# Altium footprint library PCB_Module.PcbLib: 19 footprints (part 2 of 2)
Each footprint in its own frame and in the unit in brackets; x right, y up, seen from the top. Pads: shape width x height; smd on the part's side, far side on the other; paste and mask are expansions set on the pad; w line width, h text height; cw(c..) or ccw(c..) is an arc to the next point about the centre after c.
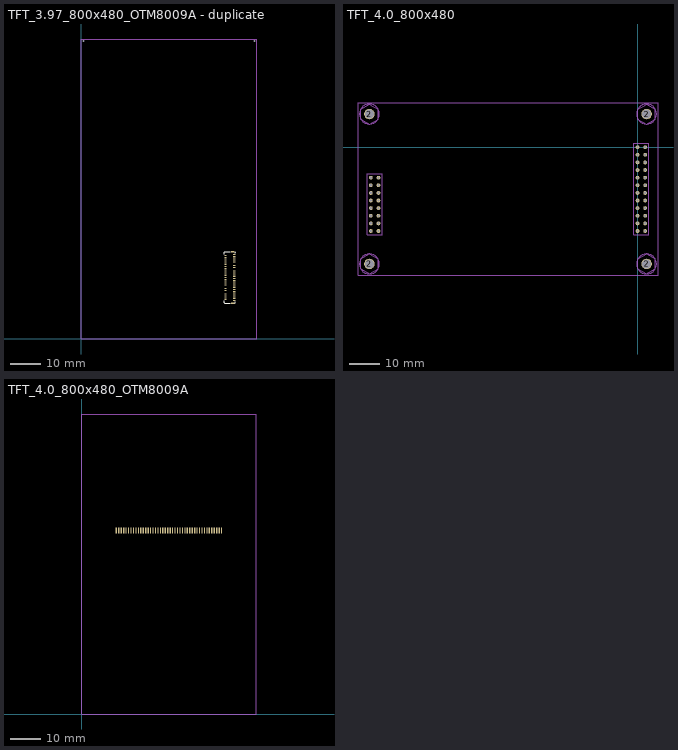
[diagram p1: the footprints below, top view; thin cyan lines are the x and y axes]

## TFT_3.97_800x480_OTM8009A - duplicate [mil]
pads (55):
  round 0 hole 25 mask+0: 0(31.5,3827.38) 0(2226.5,3827.38)
  rect 40x16 smd: 0(1947,459.27) 0(1947,1118.72)
  rect 30x12 smd: 1(1967,1084.28) 2(1855,1072.46) 3(1967,1060.65) 4(1855,1048.84) 5(1967,1037.03) 6(1855,1025.22) 7(1967,1013.41) 8(1855,1001.6) 9(1967,989.79) 10(1855,977.98) 11(1967,966.16) 12(1855,954.35) 13(1967,942.54) 14(1855,930.73) 15(1967.19,918.92) 16(1855,907.11) 17(1967,895.3) 18(1855,883.49) 19(1967,871.68) 20(1855,859.87) 21(1967,848.05) 22(1855,836.24) 23(1967,824.43) 24(1855,812.62) 25(1967,800.81) 26(1855,789) 27(1967,777.19) 28(1855,765.38) 29(1967,753.57) 30(1855,741.76) 31(1967,729.95) 32(1855,718.13) 33(1967,706.32) 34(1855,694.51) 35(1967,682.7) 36(1855,670.89) 37(1967,659.08) 38(1855,647.27) 39(1967,635.46) 40(1855,623.65) 41(1967,611.84) 42(1855,600.02) 43(1967,588.21) 44(1855,576.4) 45(1967,564.59) 46(1855,552.78) 47(1967,540.97) 48(1855,529.16) 49(1967,517.35) 50(1855,505.54) 51(1967,493.73)
Top Overlay:
  lines w6: 1841,491 1841,464 1846,459 ; 1841,1087 1841,1114 1846,1119 ; 1846.28,459 1918,459 ; 1846.28,1119 1918,1119 ; 1976,459 1981,464 1981,479 ; 1976,1119 1981,1114 1981,1099
Mechanical 13:
  lines w2: 0,0 2258,0 2258,3851 0,3851 0,0
T-Component:
  lines w2: 0,0 2258,0 2258,3851 0,3851 0,0
3D body "10061122511420hlf.stp": height 35.43, standoff 0, extent 1842.15,452.4 1979.55,1125.62

## TFT_4.0_800x480 [mil]
pads (44):
  round 50 hole 31: 1(0,0) 2(100,0) 3(0,-100) 4(100,-100) 5(0,-200) 6(100,-200) 7(0,-300) 8(100,-300) 9(0,-400) 10(100,-400) 11(0,-500) 12(100,-500) 13(0,-600) 14(100,-600) 15(0,-700) 16(100,-700) 17(0,-800) 18(100,-800) 19(0,-900) 20(100,-900) 21(0,-1000) 22(100,-1000) 23(0,-1100) 24(100,-1100) 25(-3500,-400) 26(-3400,-400) 27(-3500,-500) 28(-3400,-500) 29(-3500,-600) 30(-3400,-600) 31(-3500,-700) 32(-3400,-700) 33(-3500,-800) 34(-3400,-800) 35(-3500,-900) 36(-3400,-900) 37(-3500,-1000) 38(-3400,-1000) 39(-3500,-1100) 40(-3400,-1100)
  round 137.8 hole 118.11 mask+0: 2(-3518.5,-1532.5) 2(-3518.5,435) 2(118.5,-1532.5) 2(118.5,435)
Mechanical 13:
  circle w2: c118.5,435 r130.98
  circle w2: c-3518.5,435 r130.98
  circle w2: c-3518.5,-1532.5 r130.98
  circle w2: c118.5,-1532.5 r130.98
  lines w2: -3668.5,-1682.5 -3668.5,585 268.5,585 268.5,-1682.5 -3668.5,-1682.5 ; -3631.93,-1597.99 -3631.93,-1467.01 -3518.5,-1401.52 -3405.08,-1467.01 -3405.08,-1597.99 -3518.5,-1663.48 -3631.93,-1597.99 ; -3631.93,369.51 -3631.93,500.49 -3518.5,565.98 -3405.08,500.49 -3405.08,369.51 -3518.5,304.02 -3631.93,369.51 ; -3550,-1150 -3350,-1150 -3350,-350 -3550,-350 -3550,-1150 ; -50,-1150 150,-1150 150,50 -50,50 -50,-1150 ; 5.07,-1597.99 118.5,-1663.48 231.93,-1597.99 231.93,-1467.01 118.5,-1401.52 5.07,-1467.01 5.07,-1597.99 ; 5.07,369.51 5.07,500.49 118.5,565.98 231.93,500.49 231.93,369.51 118.5,304.02 5.07,369.51
B-Component:
  lines w1: -3510,-400 -3490,-400 ; -3500,-410 -3500,-390 ; -10,0 10,0 ; 0,-10 0,10

## TFT_4.0_800x480_OTM8009A [mm]
pads (44):
  rect 0.4x2 smd: 1(11.3,60) 2(12.1,60) 3(12.9,60) 4(13.7,60) 5(14.5,60) 6(15.3,60) 7(16.1,60) 8(16.9,60) 9(17.7,60) 10(18.5,60) 11(19.3,60) 12(20.1,60) 13(20.9,60) 14(21.7,60) 15(22.5,60) 16(23.3,60) 17(24.1,60) 18(24.9,60) 19(25.7,60) 20(26.5,60) 21(27.3,60) 22(28.1,60) 23(28.9,60) 24(29.7,60) 25(30.5,60) 26(31.3,60) 27(32.1,60) 28(32.9,60) 29(33.7,60) 30(34.5,60) 31(35.3,60) 32(36.1,60) 33(36.9,60) 34(37.7,60) 35(38.5,60) 36(39.3,60) 37(40.1,60) 38(40.9,60) 39(41.7,60) 40(42.5,60) 41(43.3,60) 42(44.1,60) 43(44.9,60) 44(45.7,60)
Mechanical 13:
  lines w0.051: 0,0 57.023,0 57.023,98.044 0,98.044 0,0